# Altium footprint library OneBoxLib_RCL.PcbLib: 50 footprints (part 2 of 4)
Each footprint in its own frame and in the unit in brackets; x right, y up, seen from the top. Pads: shape width x height; smd on the part's side, far side on the other; paste and mask are expansions set on the pad; w line width, h text height; cw(c..) or ccw(c..) is an arc to the next point about the centre after c.
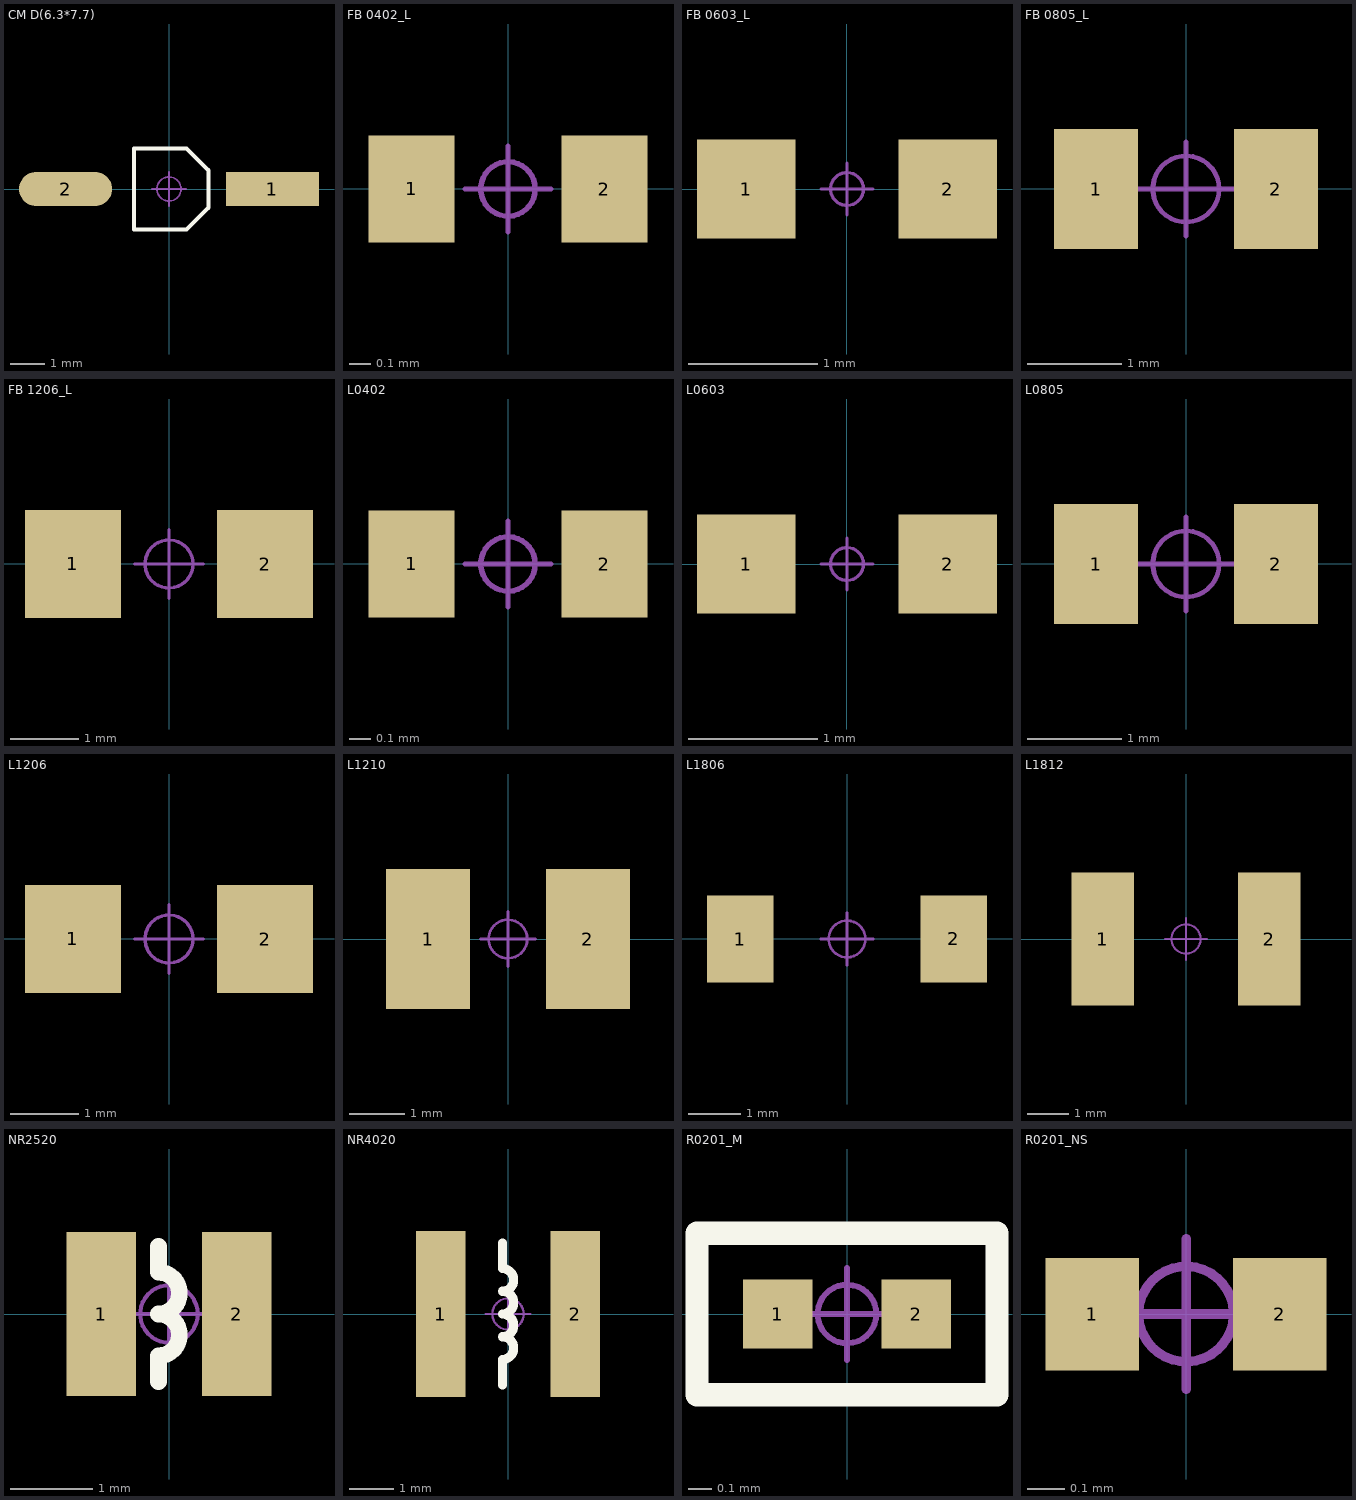
[diagram p1: the footprints below, top view; thin cyan lines are the x and y axes]

## CM D(6.3*7.7) [mm] "贴片电解电容，直径6.3mm，高7.7mm"
pads (2):
  rect 2.7x1 smd: 1(3,0)
  oval 2.7x1 smd: 2(-3,0)
Top Overlay:
  lines w0.125: -1.016,-1.175 0.508,-1.175 1.143,-0.54 1.143,0.54 0.508,1.175 -1.016,1.175 -1.016,-1.175
Mechanical 15:
  circle w0.05: c0,0 r0.35
  lines w0.05: -0.5,0 0.5,0 ; 0,-0.5 0,0.5
3D body "CM D(6.3X7.7).STEP": height 7.7, standoff -0.01, extent -3.5,-3.3 3.5,3.3

## FB 0402_L [mm] "小功率贴片磁珠"
pads (2):
  rect 0.4x0.5 smd: 1(-0.45,0) 2(0.45,0)
Mechanical 15:
  circle w0.025: c0,0 r0.127
  lines w0.025: -0.2,0 0.2,0 ; 0,-0.2 0,0.2
3D body "FB 0402.STEP": height 0.5, standoff 0, extent -0.5,-0.25 0.5,0.25

## FB 0603_L [mil] "小功率贴片磁珠"
pads (2):
  rect 30x30 smd: 1(-30.59,0) 2(30.59,0)
Mechanical 15:
  circle w1: c0,0 r5
  lines w1: -7.87,0 7.88,0 ; 0,-7.87 0,7.88
3D body "FB 0603.STEP": height 31.5, standoff -0.08, extent -31.49,-15.74 31.5,15.75

## FB 0805_L [mil] "小功率贴片磁珠"
height 19.68
pads (2):
  rect 35x50 smd: 1(-37.4,0) 2(37.4,0)
Mechanical 15:
  circle w1.97: c0,0 r13.78
  circle w1.97: c0,0 r13.78
  lines w1.97: -19.68,0 19.68,0 -19.68,0 ; 0,-19.68 0,19.68 0,-19.68
3D body "FB 0805.STEP": height 35.43, standoff -0.12, extent -39.37,-23.62 39.37,23.63

## FB 1206_L [mil] "小功率贴片磁珠"
pads (2):
  rect 55x62 smd: 1(-55.12,0) 2(55.11,0)
Mechanical 15:
  circle w1.97: c0,0 r13.78
  lines w1.97: -19.68,0 19.68,0 ; 0,-19.68 0,19.68
3D body "FB 1206.STEP": height 35.43, standoff -0.12, extent -67.99,-31.49 58,31.5

## L0402 [mm] "小功率贴片电感"
pads (2):
  rect 0.4x0.5 smd: 1(-0.45,0) 2(0.45,0)
Mechanical 15:
  circle w0.025: c0,0 r0.127
  lines w0.025: -0.2,0 0.2,0 ; 0,-0.2 0,0.2
3D body "0402.STEP": height 0.5, standoff 0, extent -0.5,-0.25 0.5,0.25

## L0603 [mil] "小功率贴片电感"
pads (2):
  rect 30x30 smd: 1(-30.59,0) 2(30.59,0)
Mechanical 15:
  circle w1: c0,0 r5
  lines w1: -7.87,0 7.88,0 ; 0,-7.87 0,7.88
3D body "l0603.STEP": height 31.5, standoff 0, extent -31.49,-15.74 31.51,15.76

## L0805 [mil] "小功率贴片电感"
height 19.68
pads (2):
  rect 35x50 smd: 1(-37.4,0) 2(37.4,0)
Mechanical 15:
  circle w1.97: c0,0 r13.78
  circle w1.97: c0,0 r13.78
  lines w1.97: -19.68,0 19.68,0 -19.68,0 ; 0,-19.68 0,19.68 0,-19.68
3D body "l0805.STEP": height 35.43, standoff 0, extent -39.36,-23.62 39.38,23.63

## L1206 [mil] "小功率贴片电感"
pads (2):
  rect 55x62 smd: 1(-55.12,0) 2(55.11,0)
Mechanical 15:
  circle w1.97: c0,0 r13.78
  lines w1.97: -19.68,0 19.68,0 ; 0,-19.68 0,19.68
3D body "1206.STEP": height 35.43, standoff 0, extent -62.99,-31.49 63,31.51

## L1210 [mm] "小功率贴片电感"
pads (2):
  rect 1.524x2.54 smd: 1(-1.45,0) 2(1.45,0)
Mechanical 15:
  circle w0.05: c0,0 r0.35
  lines w0.05: -0.5,0 0.5,0 ; 0,-0.5 0,0.5
3D body "1210.STEP": height 1.3, standoff 0, extent -1.6,-1.25 1.6,1.25

## L1806 [mil] "小功率贴片电感"
pads (2):
  rect 50x65 smd: 1(-80.01,-0.01) 2(80,0)
Mechanical 15:
  circle w1.97: c0,0 r13.78
  lines w1.97: -19.68,0 19.68,0 ; 0,-19.68 0,19.68
3D body "1806.STEP": height 62.99, standoff 0, extent -88.58,-31.49 88.59,31.5

## L1812 [mm] "小功率贴片电感"
pads (2):
  rect 1.5x3.2 smd: 1(-2,0) 2(2,0)
Mechanical 15:
  circle w0.05: c0,0 r0.35
  lines w0.05: -0.5,0 0.5,0 ; 0,-0.5 0,0.5
3D body "1812.STEP": height 1.5, standoff 0, extent -2.25,-1.6 2.25,1.6

## NR2520 [mm] "2.5mm*2.0mm*1.0mm(长*宽*高）"
pads (2):
  rect 0.85x2 smd: 1(-0.825,0) 2(0.825,0)
Top Overlay:
  lines w0.203: -0.127,-0.826 -0.127,-0.508 ccw(c-0.127,-0.254) -0.127,0 ccw(c-0.127,0.254) -0.127,0.508 -0.127,0.826
Mechanical 15:
  circle w0.05: c0,0 r0.35
  lines w0.05: -0.5,0 0.5,0 ; 0,-0.5 0,0.5
3D body "NR2520.STEP": height 1.12, standoff 0.02, extent -1.25,-1 1.25,1

## NR4020 [mm] "4.0mm*4.0mm*2.0mm(长*宽*高）"
pads (2):
  rect 1.1x3.7 smd: 1(-1.5,0) 2(1.5,0)
Top Overlay:
  lines w0.203: -0.127,-1.587 -0.127,-1.016 ccw(c-0.127,-0.762) -0.127,-0.508 ccw(c-0.127,-0.254) -0.127,0 ccw(c-0.127,0.254) -0.127,0.508 ccw(c-0.127,0.762) -0.127,1.016 -0.127,1.587
Mechanical 15:
  circle w0.05: c0,0 r0.35
  lines w0.05: -0.5,0 0.5,0 ; 0,-0.5 0,0.5
3D body "NR4020.STEP": height 2.1, standoff 0, extent -2,-2 2,2

## R0201_M [mm] "1/20W贴片电阻"
pads (2):
  rect 0.3x0.3 smd: 1(-0.3,0) 2(0.3,0)
Top Overlay:
  lines w0.102: -0.65,-0.35 0.65,-0.35 0.65,0.35 -0.65,0.35 -0.65,-0.35
Mechanical 15:
  circle w0.025: c0,0 r0.127
  lines w0.025: -0.2,0 0.2,0 ; 0,-0.2 0,0.2
3D body "R0201.STEP": height 0.23, standoff 0, extent -0.3,-0.15 0.3,0.15

## R0201_NS [mm] "1/20W贴片电阻-无丝印"
pads (2):
  rect 0.25x0.3 smd: 1(-0.25,0) 2(0.25,0)
Mechanical 15:
  circle w0.025: c0,0 r0.127
  lines w0.025: -0.2,0 0.2,0 ; 0,-0.2 0,0.2
3D body "R0201.STEP": height 0.23, standoff 0, extent -0.3,-0.15 0.3,0.15